# Altium footprint library motionboard.PcbLib: 89 footprints (part 5 of 6)
Each footprint in its own frame and in the unit in brackets; x right, y up, seen from the top. Pads: shape width x height; smd on the part's side, far side on the other; paste and mask are expansions set on the pad; w line width, h text height; cw(c..) or ccw(c..) is an arc to the next point about the centre after c.
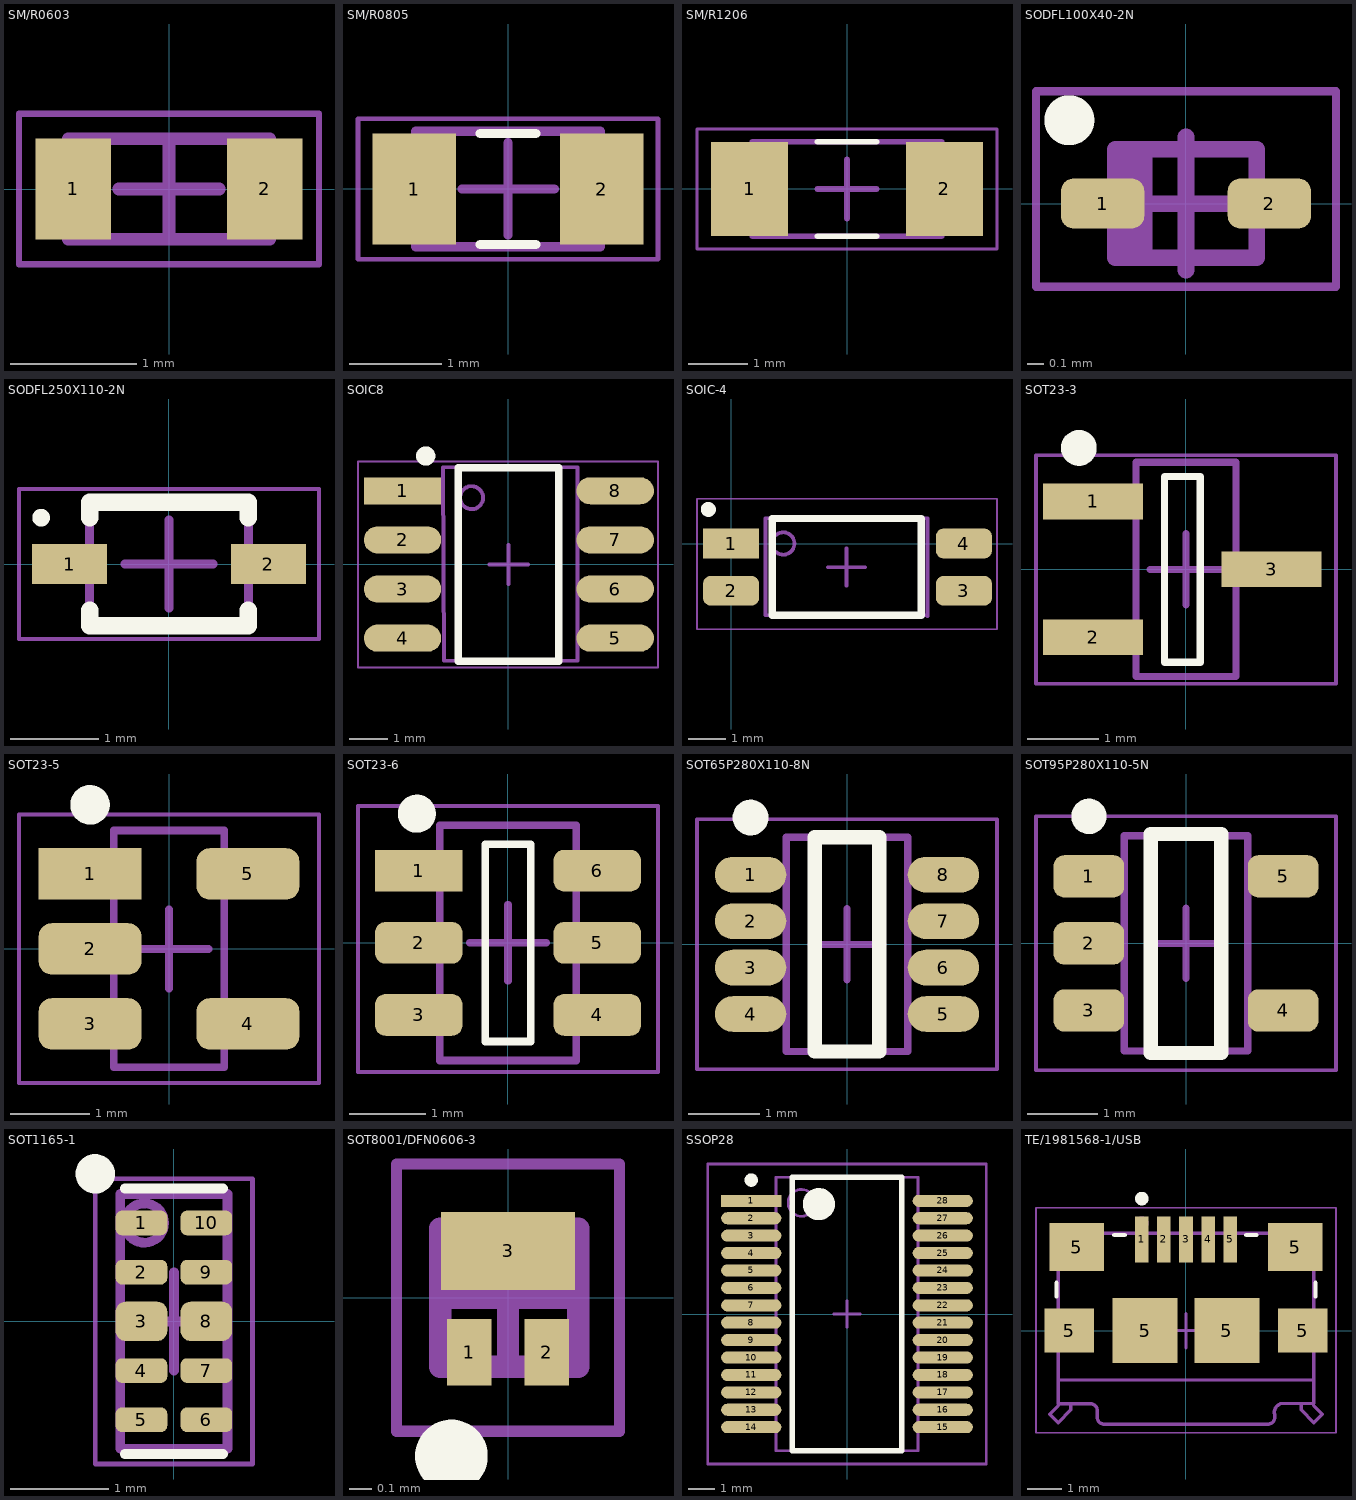
[diagram p4: the footprints below, top view; thin cyan lines are the x and y axes]

## SM/R0603 [mm] "Chip Resistor, Body 1.6x0.8mm, IPC Low Density"
height 0.6
pads (2):
  rect 0.6x0.8 smd: 1(-0.762,0) 2(0.762,0)
Top Assembly:
  lines w0.1: -0.8,-0.4 -0.8,0.4 0.8,0.4 0.8,-0.4 -0.8,-0.4
Top Courtyard:
  lines w0.05: -1.194,-0.6 -1.194,0.6 1.194,0.6 1.194,-0.6 -1.194,-0.6
  lines w0.1: -0.4,0 0.4,0 ; 0,-0.4 0,0.4
Top Designator:
  text ".Designator" at -2.705,-0.272 h1.2
3D body "RES0603-1.STEP": height 0.4, standoff 0, extent -0.8,-0.4 0.8,0.4

## SM/R0805 [mm] "Chip Resistor, Body 2.0x1.3mm, IPC Low Density"
height 0.65
pads (2):
  rect 0.9x1.2 smd: 1(-1.016,0) 2(1.016,0)
Top Overlay:
  lines w0.1: -0.3,-0.6 0.3,-0.6 ; -0.3,0.6 0.3,0.6
Top Assembly:
  lines w0.1: -1,-0.625 1,-0.625 1,0.625 -1,0.625 -1,-0.625
Top Courtyard:
  lines w0.05: -1.626,-0.762 -1.626,0.762 1.626,0.762 1.626,-0.762 -1.626,-0.762
  lines w0.1: -0.5,0 0.5,0 ; 0,-0.5 0,0.5
Top Designator:
  text ".Designator" at -2.705,-0.272 h1.2
3D body "RES_0805L.STEP": height 0.21, standoff -0.2, extent -1,-0.625 1,0.625

## SM/R1206 [mm] "Chip Resistor, Body 3.2x1.6mm, IPC Low Density"
height 0.71
pads (2):
  rect 1.3x1.6 smd: 1(-1.651,0) 2(1.651,0)
Top Overlay:
  lines w0.1: -0.5,-0.8 0.5,-0.8 ; -0.5,0.8 0.5,0.8
Top Assembly:
  lines w0.1: -1.6,-0.8 1.6,-0.8 1.6,0.8 -1.6,0.8 -1.6,-0.8
Top Courtyard:
  lines w0.05: -2.54,-1.016 2.54,-1.016 2.54,1.016 -2.54,1.016 -2.54,-1.016
  lines w0.1: -0.5,0 0.5,0 ; 0,-0.5 0,0.5
Top Designator:
  text ".Designator" at -2.705,-0.272 h1.2
3D body "R1206.STEP": height 0.55, standoff 0, extent -1.6,-0.8 1.6,0.8

## SODFL100X40-2N [mm] "SODFL, 2-Leads, Body 0.60x1.00mm, IPC Medium Density"
height 0.4
pads (2):
  rrect50% 0.5x0.3 smd: 1(-0.5,0) 2(0.5,0)
Top Overlay:
  circle w0.2: c-0.7,0.5 r0.05
Top Assembly:
  rectangle: -0.425,-0.3 -0.2,0.325
  lines w0.1: -0.425,-0.325 -0.425,0.325 0.425,0.325 0.425,-0.325 -0.425,-0.325
Top Courtyard:
  lines w0.05: -0.9,-0.5 -0.9,0.675 0.9,0.675 0.9,-0.5 -0.9,-0.5
  lines w0.1: -0.4,0 0.4,0 ; 0,-0.4 0,0.4
Top Designator:
  text ".Designator" at -2.705,-0.184 h1.2
3D body "SODFL100X40-2N.step": height 0.4, standoff 0, extent -0.5,-0.325 0.5,0.325

## SODFL250X110-2N [mm] "SODFL, 2-Leads, Body 1.25x2.50mm, IPC Medium Density"
height 1.1
pads (2):
  rect 0.85x0.45 smd: 1(-1.125,0) 2(1.125,0)
Top Overlay:
  circle w0.1: c-1.45,0.525 r0.05
  lines w0.2: -0.9,-0.525 -0.9,-0.7 0.9,-0.7 0.9,-0.525 ; -0.9,0.525 -0.9,0.7 0.9,0.7 0.9,0.525
Top Assembly:
  lines w0.1: -0.9,-0.675 0.9,-0.675 0.9,0.675 -0.9,0.675 -0.9,-0.675
Top Courtyard:
  lines w0.05: -1.7,-0.85 1.7,-0.85 1.7,0.85 -1.7,0.85 -1.7,-0.85
  lines w0.1: -0.5,0 0.5,0 ; 0,-0.5 0,0.5
Top Designator:
  text ".Designator" at -2.705,-0.272 h1.2
3D body "SODFL250X110-2N.step": height 1.1, standoff 0, extent -1.25,-0.675 1.25,0.675

## SOIC8 [mm] "8-Pin Small Outline Integrated Circuit 1.27 mm Pitch, IPC Low Density"
height 1.75
pads (8):
  rect 2x0.7 smd: 1(-2.737,1.905)
  oval 2x0.7 smd: 2(-2.737,0.635) 3(-2.737,-0.635) 4(-2.737,-1.905) 5(2.761,-1.905) 6(2.761,-0.635) 7(2.761,0.635) 8(2.761,1.905)
Top Overlay:
  circle w0.25: c-2.139,2.805 r0.125
  lines w0.2: -1.3,-2.5 -1.3,2.5 1.3,2.5 1.3,-2.5 -1.3,-2.5
Top Assembly:
  circle w0.1: c-0.954,1.727 r0.297
  lines w0.1: 1.764,-2.489 -1.665,-2.489 -1.69,2.515 1.79,2.515 1.79,-2.489
Top Courtyard:
  lines w0.05: -3.889,-2.667 -3.889,2.667 3.867,2.667 3.867,-2.667 -3.889,-2.667
  lines w0.1: -0.494,0 0.506,0 ; 0.006,-0.5 0.006,0.5
Top Designator:
  text ".Designator" at -2.716,-0.09 h1.2
3D body "SOIC-8.STEP": height 1.75, standoff 0, extent -3.034,-2.5 2.978,2.5

## SOIC-4 [mm]
pads (4):
  rect 1.5x0.8 smd: 1(0,0)
  rrect50% 1.5x0.8 smd: 2(0,-1.27) 3(6.25,-1.27) 4(6.25,0)
Top Overlay:
  circle w0.2: c-0.61,0.914 r0.1
  lines w0.2: 1.1,-1.929 5.1,-1.929 5.1,0.671 1.1,0.671 1.1,-1.929
Top Assembly:
  circle w0.1: c1.4,0 r0.3
  lines w0.1: 5.272,-1.945 5.272,0.655 ; 5.272,-1.925 0.925,-1.925 0.925,0.675 5.272,0.675
Top Courtyard:
  lines w0.05: -0.914,-2.3 7.137,-2.3 7.137,1.2 -0.914,1.2 -0.914,-2.3
  lines w0.1: 2.599,-0.635 3.599,-0.635 ; 3.099,-1.135 3.099,-0.135
Top Designator:
  text ".Designator" at 0.407,-0.822 h1.2
3D body "SOIC-4.STEP": height 2.1, standoff 0.01, extent -0.401,-1.935 6.599,0.665

## SOT23-3 [mm] "SOT23, 3-Leads, Body 3.0x2.6mm (max), Pitch 0.95mm, IPC Low Density"
height 1.1
pads (3):
  rect 1.4x0.5 smd: 1(-1.3,0.95) 2(-1.3,-0.95) 3(1.2,0)
Top Overlay:
  circle w0.3: c-1.5,1.7 r0.1
  lines w0.1: -0.3,-1.3 0.2,-1.3 0.2,1.3 -0.3,1.3 -0.3,-1.3
Top Assembly:
  lines w0.1: -0.7,-1.5 0.7,-1.5 0.7,1.5 -0.7,1.5 -0.7,-1.5
Top Courtyard:
  lines w0.05: -2.1,-1.6 -2.1,1.6 2.1,1.6 2.1,-1.6 -2.1,-1.6
  lines w0.1: -0.5,0 0.5,0 ; 0,-0.5 0,0.5
Top Designator:
  text ".Designator" at -2.705,-0.109 h1.2
3D body "SOT23-3.STEP": height 1.46, standoff 0, extent -1.575,-1.501 1.422,1.499

## SOT23-5 [mm] "SOT23, 5-Leads, Body 3.0x2.6mm (max), Pitch 0.95mm, IPC Low Density"
height 1.1
pads (5):
  rect 1.3x0.65 smd: 1(-1,0.95)
  rrect50% 1.3x0.65 smd: 2(-1,0) 3(-1,-0.95) 4(1,-0.95) 5(1,0.95)
Top Overlay:
  circle w0.25: c-1,1.825 r0.125
Top Assembly:
  lines w0.1: -0.7,-1.5 0.7,-1.5 0.7,1.5 -0.7,1.5 -0.7,-1.5
Top Courtyard:
  lines w0.05: -1.9,-1.7 -1.9,1.7 1.9,1.7 1.9,-1.7 -1.9,-1.7
  lines w0.1: -0.5,0 0.5,0 ; 0,-0.5 0,0.5
Top Designator:
  text ".Designator" at -2.705,-0.097 h1.2
3D body "SOT-23-5.STEP": height 1.45, standoff -0.01, extent -1.524,-1.5 1.476,1.5

## SOT23-6 [mm] "SOT23, 6-Leads, Body 3.1x3.2mm (max), Pitch 0.95mm, IPC Medium Density"
height 1.45
pads (6):
  rect 1.15x0.55 smd: 1(-1.175,0.95)
  rrect50% 1.15x0.55 smd: 2(-1.175,0) 3(-1.175,-0.95) 4(1.175,-0.95) 5(1.175,0) 6(1.175,0.95)
Top Overlay:
  circle w0.3: c-1.2,1.7 r0.1
  lines w0.1: -0.3,-1.3 -0.3,1.3 0.3,1.3 0.3,-1.3 -0.3,-1.3
Top Assembly:
  lines w0.1: -0.9,-1.55 -0.9,1.55 0.9,1.55 0.9,-1.55 -0.9,-1.55
Top Courtyard:
  lines w0.05: -1.975,-1.7 -1.975,1.8 1.975,1.8 1.975,-1.7 -1.975,-1.7
  lines w0.1: -0.5,0 0.5,0 ; 0,-0.5 0,0.5
Top Designator:
  text ".Designator" at -2.705,-0.159 h1.2
3D body "SOT23-6.STEP": height 1.3, standoff 0, extent -1.499,-1.5 1.501,1.5

## SOT65P280X110-8N [mm] "SOT23, 8-Leads, Body 2.90x1.60mm, Pitch 0.65mm, IPC Medium Density"
height 1.1
pads (8):
  oval 1x0.5 smd: 1(-1.35,0.975) 2(-1.35,0.325) 3(-1.35,-0.325) 4(-1.35,-0.975) 5(1.35,-0.975) 6(1.35,-0.325) 7(1.35,0.325) 8(1.35,0.975)
Top Overlay:
  circle w0.25: c-1.35,1.775 r0.125
  lines w0.2: -0.45,-1.5 -0.45,1.5 0.45,1.5 0.45,-1.5 -0.45,-1.5
Top Assembly:
  lines w0.1: -0.85,-1.5 -0.85,1.5 0.85,1.5 0.85,-1.5 -0.85,-1.5
Top Courtyard:
  lines w0.05: -2.1,-1.75 -2.1,1.75 2.1,1.75 2.1,-1.75 -2.1,-1.75
  lines w0.1: -0.5,0 0.5,0 ; 0,-0.5 0,0.5
Top Designator:
  text ".Designator" at -2.705,-0.147 h1.2
3D body "TSOP65P280X110-8N.step": height 1.1, standoff 0, extent -1.4,-1.5 1.4,1.5

## SOT95P280X110-5N [mm] "SOT23, 5-Leads, Body 2.90x2.80mm, Pitch 0.95mm, IPC Medium Density"
height 1.1
pads (5):
  rrect50% 1x0.6 smd: 1(-1.375,0.95) 2(-1.375,0) 3(-1.375,-0.95) 4(1.375,-0.95) 5(1.375,0.95)
Top Overlay:
  circle w0.25: c-1.375,1.8 r0.125
  lines w0.2: -0.5,-1.55 -0.5,1.55 0.5,1.55 0.5,-1.55 -0.5,-1.55
Top Assembly:
  lines w0.1: -0.875,-1.525 0.875,-1.525 0.875,1.525 -0.875,1.525 -0.875,-1.525
Top Courtyard:
  lines w0.05: -2.125,-1.8 2.125,-1.8 2.125,1.8 -2.125,1.8 -2.125,-1.8
  lines w0.1: -0.5,0 0.5,0 ; 0,-0.5 0,0.5
Top Designator:
  text ".Designator" at -2.705,-0.159 h1.2
3D body "SOT95P280X110-5N.step": height 1.1, standoff 0, extent -1.525,-1.525 1.525,1.525

## SOT1165-1 [mm]
pads (10):
  rrect50% 0.525x0.25 smd: 1(-0.33,1) 2(-0.33,0.5) 4(-0.33,-0.5) 5(-0.33,-1) 6(0.33,-1) 7(0.33,-0.5) 9(0.33,0.5) 10(0.33,1)
  rrect50% 0.525x0.4 smd: 3(-0.33,0) 8(0.33,0)
Top Overlay:
  circle w0.2: c-0.8,1.5 r0.1
  lines w0.1: -0.5,-1.35 0.5,-1.35 ; -0.5,1.35 0.5,1.35
Top Assembly:
  circle w0.1: c-0.3,1 r0.2
  lines w0.1: -0.546,-1.295 0.546,-1.295 0.546,1.295 -0.546,1.295 -0.546,-1.295
Top Courtyard:
  lines w0.05: -0.8,-1.45 -0.8,1.45 0.8,1.45 0.8,-1.45 -0.8,-1.45
  lines w0.1: -0.5,0 0.5,0 ; 0,-0.5 0,0.5
Top Designator:
  text ".Designator" at -2.792,-0.159 h1.2
3D body "SOT1165-1.STEP": height 0.45, standoff -0.02, extent -0.501,-1.25 0.499,1.25

## SOT8001/DFN0606-3 [mm]
pads (3):
  rect 0.2x0.3 smd: 1(-0.175,-0.245) 2(0.175,-0.245)
  rect 0.6x0.35 smd: 3(0,0.21)
Top Overlay:
  circle w0.254: c-0.254,-0.711 r0.036
Top Assembly:
  lines w0.1: -0.305,-0.31 0.315,-0.31 0.315,0.31 -0.305,0.31 -0.305,-0.31
Top Courtyard:
  lines w0.05: -0.5,-0.6 0.5,-0.6 0.5,0.6 -0.5,0.6 -0.5,-0.6
  lines w0.1: -0.3,0 0.3,0 ; 0,-0.3 0,0.3
Top Designator:
  text ".Designator" at -2.705,-0.396 h1.2
3D body "SOT8001.STEP": height 0.37, standoff 0, extent -0.305,-0.31 0.315,0.31

## SSOP28 [mm]
height 2
pads (28):
  rect 2.25x0.45 smd: 1(-3.575,4.225)
  oval 2.25x0.45 smd: 2(-3.575,3.575) 3(-3.575,2.925) 4(-3.575,2.275) 5(-3.575,1.625) 6(-3.575,0.975) 7(-3.575,0.325) 8(-3.575,-0.325) 9(-3.575,-0.975) 10(-3.575,-1.625) 11(-3.575,-2.275) 12(-3.575,-2.925) 13(-3.575,-3.575) 14(-3.575,-4.225) 15(3.575,-4.225) 16(3.575,-3.575) 17(3.575,-2.925) 18(3.575,-2.275) 19(3.575,-1.625) 20(3.575,-0.975) 21(3.575,-0.325) 22(3.575,0.325) 23(3.575,0.975) 24(3.575,1.625) 25(3.575,2.275) 26(3.575,2.925) 27(3.575,3.575) 28(3.575,4.225)
Top Overlay:
  circle w0.25: c-3.575,5 r0.125
  circle w0.6: c-1.05,4.1 r0.3
  lines w0.2: -2.05,-5.1 -2.05,5.1 2.05,5.1 2.05,-5.1 -2.05,-5.1
Top 3D Body:
  circle w0.1: c-1.7,4.15 r0.5
  lines w0.1: -2.65,-5.1 -2.65,5.1 2.65,5.1 2.65,-5.1 -2.65,-5.1
Top Courtyard:
  lines w0.1: -0.5,0 0.5,0 ; 0,-0.5 0,0.5 ; -5.2,-5.6 -5.2,5.6 5.2,5.6 5.2,-5.6 -5.2,-5.6
Top Designator:
  text ".Designator" at -2.705,-0.272 h1.2
3D body "User Library-SSOP-28.STEP": height 1.92, standoff -0.03, extent -4.087,-5.242 4.138,5.258

## TE/1981568-1/USB [mm]
pads (11):
  rect 0.4x1.35 smd: 1(-1.3,2.675) 2(-0.65,2.675) 3(0,2.675) 4(0.65,2.675) 5(1.3,2.675)
  rect 1.45x1.3 smd: 5(-3.425,0) 5(3.425,0)
  rect 1.6x1.4 smd: 5(-3.2,2.45) 5(3.2,2.45)
  rect 1.9x1.9 smd: 5(-1.2,0) 5(1.2,0)
Top Overlay:
  circle w0.2: c-1.295,3.87 r0.1
  lines w0.127: -3.8,1 -3.8,1.4 ; -2.1,2.8 -1.8,2.8 ; 1.77,2.8 2.07,2.8 ; 3.8,1 3.8,1.4
Top Assembly:
  circle w0.2: c-1.3,3.148 r0.1
  lines w0.1: -3.78,-0.415 -3.98,-0.415 -3.98,0.445 -3.76,0.445 ; -3.75,-2.2 -4,-2.45 -3.75,-2.7 -3.375,-2.325 -3.375,-2.2 ; 2.6,-2.465 2.6,-2.55 cw(c2.4,-2.55) 2.4,-2.75 -2.4,-2.75 cw(c-2.4,-2.55) -2.6,-2.55 -2.6,-2.35 ccw(c-2.8,-2.35) -2.8,-2.15 -3.75,-2.15 -3.75,-1.45 ; 2.6,-2.463 cw(c2.863,-2.402) 2.802,-2.14 ; 2.8,-2.14 3.75,-2.14 3.75,-1.45 ; 3.375,-2.2 3.375,-2.325 3.75,-2.7 4,-2.45 3.75,-2.2 ; 3.76,0.425 4.02,0.425 4.02,-0.435 3.77,-0.435 ; -3.75,-1.45 -3.75,2.85 3.75,2.85 3.75,-1.45 ; -3.75,-1.45 3.75,-1.45
Top Courtyard:
  lines w0.05: -4.4,-3 -4.4,3.6 4.4,3.6 4.4,-3 -4.4,-3
  lines w0.1: -0.5,0 0.5,0 ; 0,-0.5 0,0.5
Top Designator:
  text ".Designator" at -2.705,0.251 h1.2
3D body "1981568-1.stp.STEP": height 2.81, standoff -0.27, extent -4,-2.679 4,2.921